# Altium footprint library chipfc_extras_footprint.PCBLIB: 89 footprints (part 1 of 6)
Each footprint in its own frame and in the unit in brackets; x right, y up, seen from the top. Pads: shape width x height; smd on the part's side, far side on the other; paste and mask are expansions set on the pad; w line width, h text height; cw(c..) or ccw(c..) is an arc to the next point about the centre after c.
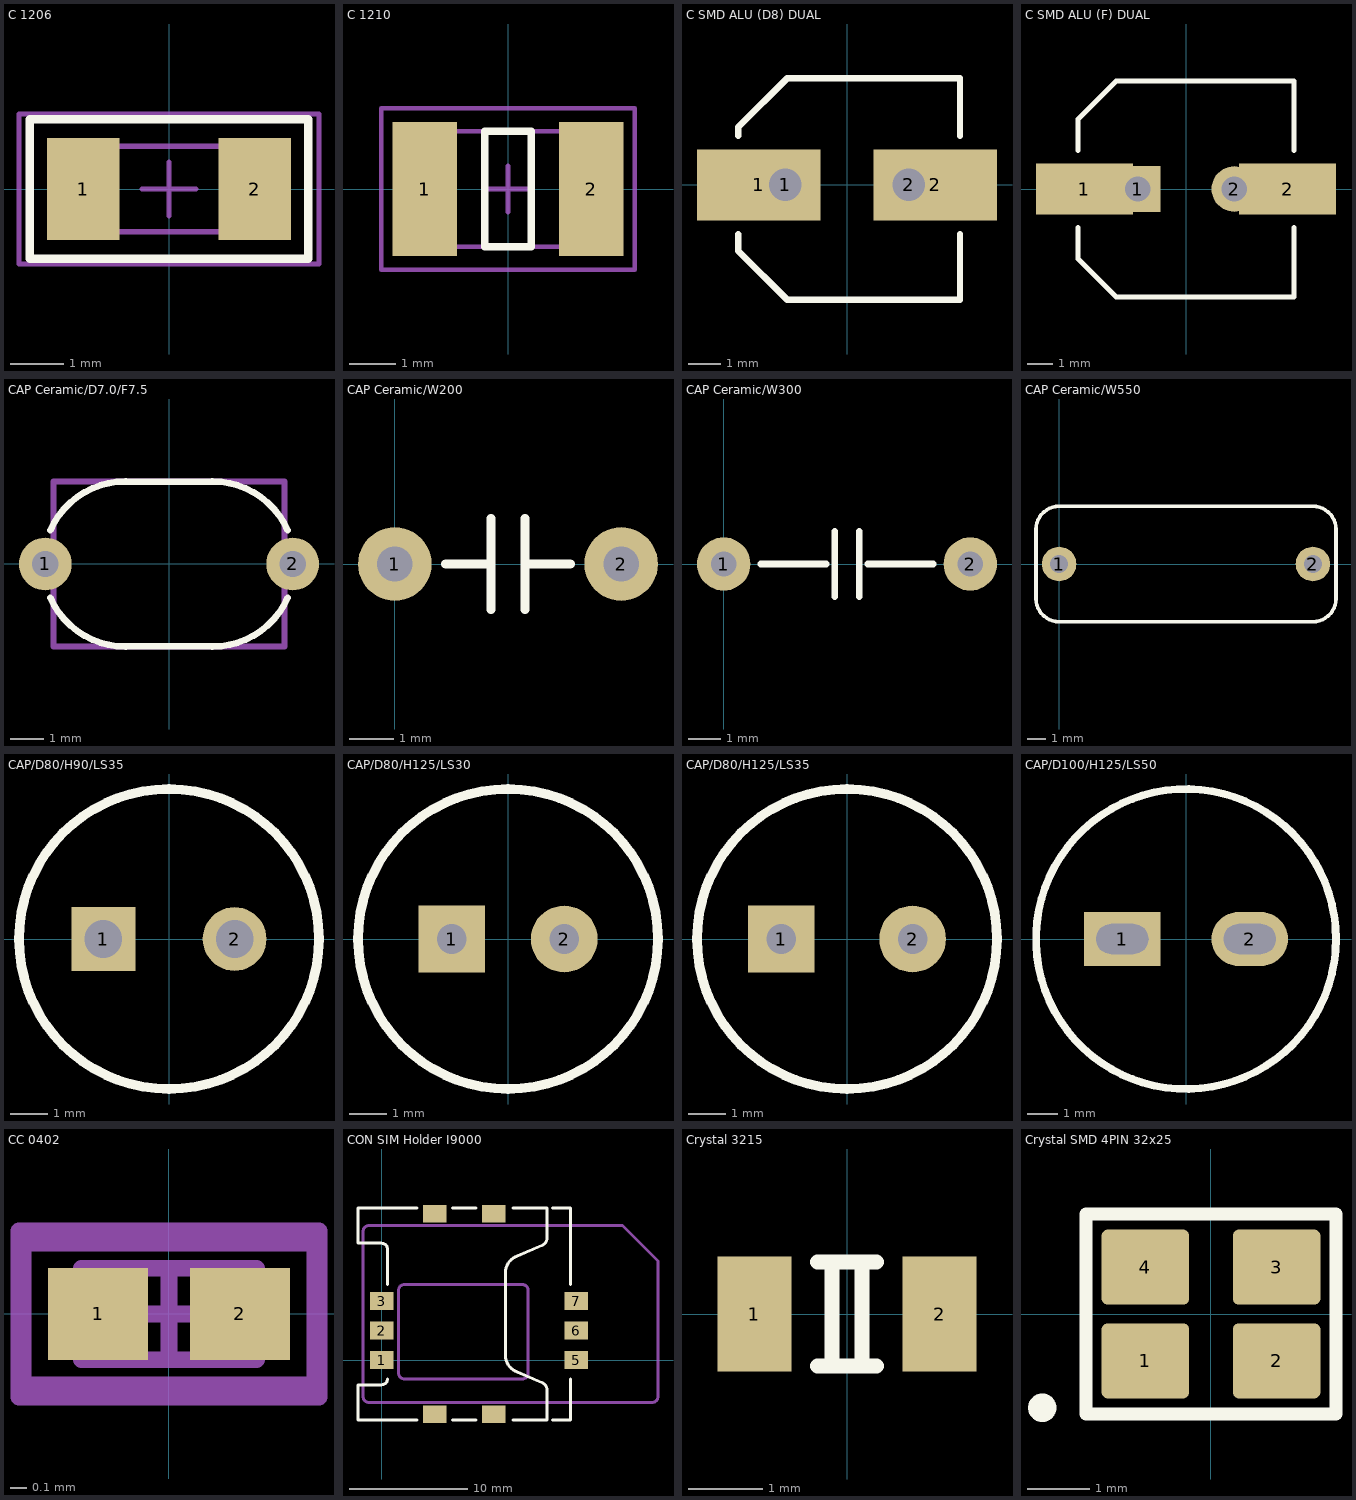
[diagram p0: the footprints below, top view; thin cyan lines are the x and y axes]

## C 1206 [mm]
height 0.85
pads (2):
  rect 1.35x1.9 smd: 1(-1.6,0) 2(1.6,0)
Top Overlay:
  lines w0.16: -2.6,-1.3 2.6,-1.3 2.6,1.3 -2.6,1.3 -2.6,-1.3
Mechanical 13:
  lines w0.1: -1.6,-0.8 1.6,-0.8 1.6,0.8 -1.6,0.8 -1.6,-0.8
Mechanical 15:
  lines w0.1: -0.5,0 0.5,0 ; 0,-0.5 0,0.5 ; -2.8,-1.4 -2.8,1.4 2.8,1.4 2.8,-1.4 -2.8,-1.4
3D body "User Library-CR3216-1206.step": height 0.6, standoff 0, extent -1.6,-0.8 1.6,0.8

## C 1210 [mm]
height 0.85
pads (2):
  rect 1.4x2.9 smd: 1(-1.8,0) 2(1.8,0)
Top Overlay:
  lines w0.16: -0.5,-1.25 -0.5,1.25 0.5,1.25 0.5,-1.25 -0.5,-1.25
Mechanical 13:
  lines w0.1: -1.6,-1.25 -1.6,1.25 1.6,1.25 1.6,-1.25 -1.6,-1.25
Mechanical 15:
  lines w0.1: -0.5,0 0.5,0 ; 0,-0.5 0,0.5 ; -2.75,-1.75 2.75,-1.75 2.75,1.75 -2.75,1.75 -2.75,-1.75
3D body "User Library-SMD CAPACITOR.step": height 0.79, standoff 0.01, extent -1.6,-1.25 1.6,1.25

## C SMD ALU (D8) DUAL [mm] "SMD Aluminum Electrolytic Capacitor, size D8 (6.3 x 7.7 mm)"
height 7.7
pads (4):
  rect 3.81x2.2 smd: 1(-2.73,0) 2(2.73,0)
  rect 1.8x1.8 hole 1: 1(-1.905,0)
  round 1.8 hole 1: 2(1.905,0)
Top Overlay:
  lines w0.2: -3.365,-1.524 -3.365,-2.032 -1.841,-3.556 3.492,-3.556 3.492,-1.524 ; -3.365,1.524 -3.365,1.778 -1.841,3.302 3.492,3.302 3.492,1.524
3D body "User Library-ALU-D8.STEP": height 7.7, standoff 0, extent -3.5,-3.427 3.5,3.173

## C SMD ALU (F) DUAL [mm] "SMD Aluminum Electrolytic Capacitor, size F (8.0 x 10.2 mm)"
height 10.2
pads (4):
  rect 3.81x2 smd: 1(-4,0) 2(4,0)
  rect 1.8x1.8 hole 1: 1(-1.905,0)
  round 1.8 hole 1: 2(1.905,0)
Top Overlay:
  lines w0.2: -4.25,-1.524 -4.25,-2.75 -2.75,-4.25 4.25,-4.25 4.25,-1.524 ; -4.25,1.524 -4.25,2.75 -2.75,4.25 4.25,4.25 4.25,1.524
3D body "User Library-ALU-F.STEP": height 10.2, standoff 0, extent -4.95,-4.15 4.95,4.15

## CAP Ceramic/D7.0/F7.5 [mm]
pads (2):
  round 1.6 hole 0.8: 1(-3.75,0) 2(3.75,0)
Top Overlay:
  lines w0.2: -3.6,-1.025 ccw(c-1.316,-0.008) -1.316,-2.508 ; -3.6,1.025 cw(c-1.316,0.008) -1.316,2.508 ; -1.5,-2.5 1.5,-2.5 ; -1.5,2.5 1.5,2.5 ; 1.316,-2.508 ccw(c1.316,-0.008) 3.6,-1.025 ; 1.316,2.508 cw(c1.316,0.008) 3.6,1.025
Mechanical 1:
  lines w0.178: -3.5,-2.5 3.5,-2.5 3.5,2.5 -3.5,2.5 -3.5,-2.5
3D body "User Library-Panasonic ECK-A3D102KBP.step": height 8.63, standoff -4.57, extent -4.001,-1.198 4,1.198
3D body: height 10.49, standoff 3.01, extent -3.72,-2.5 3.75,2.5

## CAP Ceramic/W200 [mil]
pads (2):
  round 65 hole 31: 1(0,0) 2(200,0)
Top Overlay:
  lines w8: 45,0 85,0 ; 85,-40 85,40 ; 115,-40 115,40 ; 115,0 155,0
3D body "User Library-CAP CERAMICO.step": height 180.55, standoff -35.1, extent -5.56,-41.67 205.5,41.01

## CAP Ceramic/W300 [mil]
pads (2):
  round 65 hole 31: 1(0,0) 2(300,0)
Top Overlay:
  lines w8: 45,0 125,0 ; 135,-40 135,40 ; 165,-40 165,40 ; 175,0 255,0
3D body "User Library-Panasonic ECK-A3D102KBP.step": height 339.84, standoff -180, extent -7.5,-47.15 307.5,47.16

## CAP Ceramic/W550 [mil]
pads (2):
  round 75 hole 39: 1(0,0) 2(550,0)
Top Overlay:
  lines w8: -50,-75 ccw(c0,-75) 0,-125 550,-125 ccw(c550,-75) 600,-75 600,75 ccw(c550,75) 550,125 0,125 ccw(c0,75) -50,75 -50,-75

## CAP/D80/H90/LS35 [mm] "Dia 8mm, Heigh 12.5mm, Lead Space 3mm (4.7uF/400V small)"
pads (2):
  rect 1.7x1.7 hole 1: 1(-1.75,0)
  round 1.7 hole 1: 2(1.75,0)
Top Overlay:
  circle w0.254: c0,0 r4
3D body "User Library-NIC_NRE-L221M10V8X9 _220MF_6_3V_Radial_Minature_Capacitor.step": height 9.91, standoff -3.17, extent -4.128,-4.127 4.127,4.128

## CAP/D80/H125/LS30 [mil] "Dia 8mm, Heigh 12.5mm, Lead Space 3mm (4.7uF/400V small)"
pads (2):
  rect 70x70 hole 31: 1(-59.06,0)
  round 70 hole 31: 2(59.06,0)
Top Overlay:
  circle w10: c0,0 r157.48
3D body "User Library-CAP 8X11_5.STEP": height 454.24, standoff -746.06, extent -157.48,-157.48 157.48,157.48

## CAP/D80/H125/LS35 [mil] "Dia 8mm, Heigh 12.5mm, Lead Space 3.5mm (470uF/16V small)"
pads (2):
  rect 70x70 hole 31: 1(-68.9,0)
  round 70 hole 31: 2(68.9,0)
Top Overlay:
  circle w10: c0,0 r157.48
3D body "User Library-CAP 8X11_5.STEP": height 454.24, standoff -746.06, extent -157.48,-157.48 157.48,157.48

## CAP/D100/H125/LS50 [mm] "Dia 8mm, Heigh 12.5mm, Lead Space 3.5mm (470uF/16V small)"
pads (2):
  rect 2.55x1.8 hole 1 slot 1.75 at 0 deg: 1(-2.125,0)
  oval 2.55x1.8 hole 1 slot 1.75 at 0 deg: 2(2.125,0)
Top Overlay:
  circle w0.254: c0,0 r5
3D body "User Library-Cap electro 10x12_5x5_0mm.step": height 12.78, standoff -3.73, extent -5.025,-5.025 5.026,5.026

## CC 0402 [mm] "Chip Capacitor, 2-Leads, Body 1.0x0.5mm, IPC Medium Density"
height 0.55
pads (2):
  rect 0.6x0.55 smd: 1(-0.425,0) 2(0.425,0)
Mechanical 13:
  lines w0.1: -0.525,-0.275 -0.525,0.275 0.525,0.275 0.525,-0.275 -0.525,-0.275
Mechanical 15:
  lines w0.1: -0.275,0 0.275,0 ; 0,-0.275 0,0.275 ; -0.875,-0.425 -0.875,0.425 0.875,0.425 0.875,-0.425 -0.875,-0.425
Mechanical 31:
  lines w0.1: -0.9,-0.5 -0.9,0.5 0.9,0.5 0.9,-0.5 -0.9,-0.5
3D body "User Library-CAPC1005X06.step": height 0.6, standoff 0, extent -0.5,-0.25 0.5,0.25

## CON SIM Holder I9000 [mm] "Molex's SIM Holder,  6 pins"
pads (10):
  rect 2x1.5 smd: 1(0,0) 2(0,2.5) 3(0,5) 5(16.5,0) 6(16.5,2.5) 7(16.5,5) ""(4.5,-4.6) ""(4.5,12.4) ""(9.5,-4.6) ""(9.5,12.4)
Top Overlay:
  lines w0.254: 0.5,-1.6 cw(c0,-1.6) 0,-2.1 -2,-2.1 -2,-5.1 3,-5.1 ; 3,12.9 -2,12.9 -2,9.9 0,9.9 cw(c0,9.4) 0.5,9.4 0.5,6.4 ; 6,-5.1 8,-5.1 ; 6,12.9 8,12.9 ; 11.12,-5.1 14,-5.1 14,-2.5 ; 11.12,12.9 14,12.9 14,10.3 ; 14.008,-2.5 ccw(c13.4,-2.5) 13.6,-1.926 11.504,-1.016 cw(c12,0.4) 10.5,0.4 10.5,7.4 cw(c12,7.4) 11.504,8.816 13.6,9.726 ccw(c13.4,10.3) 14.008,10.3 ; 14.5,-5.1 16,-5.1 16,-1.6 ; 14.5,12.9 16,12.9 16,6.4 ; 0.5,6.4 0.5,6.4
Mechanical 1:
  lines w0.254: -1.57,-3.1 ccw(c-1.07,-3.1) -1.07,-3.6 22.93,-3.6 ccw(c22.93,-3.1) 23.43,-3.1 23.43,8.4 20.43,11.4 -1.07,11.4 ccw(c-1.07,10.9) -1.57,10.9 -1.57,-3.1 ; 1.43,-1.1 ccw(c1.93,-1.1) 1.93,-1.6 11.93,-1.6 ccw(c11.93,-1.1) 12.43,-1.1 12.43,5.9 ccw(c11.93,5.9) 11.93,6.4 1.93,6.4 ccw(c1.93,5.9) 1.43,5.9 1.43,-1.1

## Crystal 3215 [mm] "Crystal 3.2mm x 1.5mm SMD"
pads (2):
  rect 1x1.55 smd: 1(-1.25,0) 2(1.25,0)
Top Overlay:
  lines w0.203: -0.4,-0.7 0.4,-0.7 ; -0.4,0.7 0.4,0.7 ; -0.2,-0.7 -0.2,0.7 ; 0.2,-0.7 0.2,0.7
3D body "User Library-Siward_SX3215.step": height 0.81, standoff 0, extent -1.6,-0.75 1.6,0.75

## Crystal SMD 4PIN 32x25 [mm]
pads (4):
  rrect15% 1.4x1.2 smd: 1(-1.05,-0.75) 2(1.05,-0.75) 3(1.05,0.75) 4(-1.05,0.75)
Top Overlay:
  circle w0.254: c-2.7,-1.5 r0.1
  lines w0.203: -2,-1.6 -2,1.6 2,1.6 2,-1.6 -2,-1.6
3D body "User Library-User Library-Siward_SX3225.step": height 0.81, standoff 0, extent -1.6,-1.25 1.6,1.25